# Altium integrated library Connector-SIL-THP.IntLib: 464 symbols (part 1 of 2) (continued)
## HDR1X36MR2.54THP (continued)

## HTSW-104-8-G-S-RA
designator P?
Header SIL Male THP, 2.54mm Pitch Rt Angle; Manufacturer: Samtec; Package: HTSW-104-8-G-S-RA; EDM-PN: *; Text2: *; Text1: *; Value: HTSW-104-8-G-S-RA; Part Number: HTSW-104-8-G-S-RA; SAAB PN: *
footprint HTSW-104-8-G-S-RA
pins: 1, 2, 3, 4

## HTSW-110-42-G-S
designator P?
Header SIL Male THP, 2.54mm Pitch; Manufacturer: Samtec; Package: TSW-110-14-G-S; EDM-PN: *; Text2: *; Text1: *; Value: HTSW-110-42-G-S; Part Number: HTSW-110-42-G-S; SAAB PN: *
footprint TSW-110-14-G-S (SIL Strip 2.54mm)
pins: 1, 2, 3, 4, 5, 6, 7, 8, 9, 10

## HTSW-110-42-G-S-Rev
designator P?
Header SIL Male THP, 2.54mm Pitch - Reverse mount; Manufacturer: Samtec; Package: TSW-110-14-G-S-Rev; EDM-PN: *; Text2: *; Text1: *; Part Number: HTSW-110-42-G-S; Value: HTSW-110-42-G-S-Rev; SAAB PN: *
footprint TSW-110-14-G-S-REV (SIL Strip 2.54mm - Reverse mount)
pins: 1, 2, 3, 4, 5, 6, 7, 8, 9, 10

## HW-04-08-G-S-393-078
designator P?
Header SIL Male THP, 2.54mm Pitch; Manufacturer: Samtec; Package: HW-04-08-G-S-393-078; EDM-PN: *; Text2: *; Text1: *; Value: HW-04-08-G-S-393-078; Part Number: HW-04-08-G-S-393-078; SAAB PN: *
footprint HW-04-08-G-S-393-078
pins: 1, 2, 3, 4

## HW-05-08-G-S-393-078
designator P?
Header SIL Male THP, 2.54mm Pitch; Manufacturer: Samtec; Package: HW-05-08-G-S-393-078; EDM-PN: *; Text2: *; Text1: *; Value: HW-05-08-G-S-393-078; Part Number: HW-05-08-G-S-393-078; SAAB PN: *
footprint HW-05-08-G-S-393-078
pins: 1, 2, 3, 4, 5

## Jumper-2mm-60800213421-No Part
designator P?, comment 60800213421  (mechanical)
Header SIL Male THP, 2.00mm Pitch; Manufacturer: Wurth; Package: NA; EDM-PN: *; Text2: *; Text1: *; Value: 60800213421; SAAB PN: *; Part Number: 60800213421

## KK-LOCK-2-3.96mm
designator P?  value KK-2-3.96  (hidden comment: KK-LOCK-2-3.96mm)
KK SIL Header with Lock; Manufacturer: Molex; Package: M5273-2; EDM-PN: *; Text2: *; Text1: *; Part Number: 09-65-2028; SAAB PN: *
footprint M5273-2 (Header Friction Lock 3.96 7.16x10.2mm)
pins: 1, 2

## KK-LOCK-2-3.96mm-RT
designator P?  value KK-2-3.96-RT  (hidden comment: KK-LOCK-2-3.96mm-RT)
Header Friction Lock Rt Angle; Manufacturer: Molex; Package: M41792-02-RT; EDM-PN: *; Text2: *; Text1: *; Part Number: 26-60-5020; SAAB PN: *
footprint M41792-02-RT (M41792 3.96mm)
pins: 1, 2

## KK-LOCK-3-3.96mm
designator P?  value KK-3-3.96  (hidden comment: KK-LOCK-3-3.96mm)
KK SIL Header with Lock; Manufacturer: Molex; Package: M5273-3; EDM-PN: *; Text2: *; Text1: *; Part Number: 09-65-2038; SAAB PN: *
footprint M5273-3 (Header Friction Lock 3.96 11.12x10.2mm)
pins: 1, 2, 3

## KK-LOCK-3-3.96mm-RT
designator P?  value KK-3-3.96-RT  (hidden comment: KK-LOCK-3-3.96mm-RT)
Header Friction Lock Rt Angle; Manufacturer: Molex; Package: M41792-03-RT; EDM-PN: *; Text2: *; Text1: *; Part Number: 26-60-5030; SAAB PN: *
footprint M41792-03-RT (M41792 3.96mm)
pins: 1, 2, 3

## KK-LOCK-4-3.96mm
designator P?  value KK-4-3.96  (hidden comment: KK-LOCK-4-3.96mm)
KK SIL Header with Lock; Manufacturer: Molex; Package: M5273-4; EDM-PN: *; Text2: *; Text1: *; Part Number: 09-65-2048; SAAB PN: *
footprint M5273-4 (Header Friction Lock 3.96 15.08x10.2mm)
pins: 1, 2, 3, 4

## KK-LOCK-4-3.96mm-RT
designator P?  value KK-4-3.96-RT  (hidden comment: KK-LOCK-4-3.96mm-RT)
Header Friction Lock Rt Angle; Manufacturer: Molex; Package: M41792-04-RT; EDM-PN: *; Text2: *; Text1: *; Part Number: 26-60-5040; SAAB PN: *
footprint M41792-04-RT (M41792 3.96mm)
pins: 1, 2, 3, 4

## KK-LOCK-5-3.96mm
designator P?  value KK-5-3.96  (hidden comment: KK-LOCK-5-3.96mm)
KK SIL Header with Lock; Manufacturer: Molex; Package: M5273-5; EDM-PN: *; Text2: *; Text1: *; Part Number: 09-65-2058; SAAB PN: *
footprint M5273-5 (Header Friction Lock 3.96 19.04x10.2mm)
pins: 1, 2, 3, 4, 5

## KK-LOCK-5-3.96mm-RT
designator P?  value KK-5-3.96-RT  (hidden comment: KK-LOCK-5-3.96mm-RT)
Header Friction Lock Rt Angle; Manufacturer: Molex; Package: M41792-05-RT; EDM-PN: *; Text2: *; Text1: *; Part Number: 26-60-5050; SAAB PN: *
footprint M41792-05-RT (M41792 3.96mm)
pins: 1, 2, 3, 4, 5

## KK-LOCK-6-3.96mm
designator P?  value KK-6-3.96  (hidden comment: KK-LOCK-6-3.96mm)
KK SIL Header with Lock; Manufacturer: Molex; Package: M5273-6; EDM-PN: *; Text2: *; Text1: *; Part Number: 09-65-2068; SAAB PN: *
footprint M5273-6 (Header Friction Lock 3.96 23.00x10.2mm)
pins: 1, 2, 3, 4, 5, 6

## KK-LOCK-7-3.96mm
designator P?  value KK-7-3.96  (hidden comment: KK-LOCK-7-3.96mm)
KK SIL Header with Lock; Manufacturer: Molex; Package: M5273-7; EDM-PN: *; Text2: *; Text1: *; Part Number: 09-65-2078; SAAB PN: *
footprint M5273-7 (Header Friction Lock 3.96 26.96x10.2mm)
pins: 1, 2, 3, 4, 5, 6, 7

## KK-LOCK-8-3.96mm
designator P?  value KK-8-3.96  (hidden comment: KK-LOCK-8-3.96mm)
KK SIL Header with Lock; Manufacturer: Molex; Package: M5273-8; EDM-PN: *; Text2: *; Text1: *; Part Number: 09-65-2088; SAAB PN: *
footprint M5273-8 (Header Friction Lock 3.96 30.92x10.2mm)
pins: 1, 2, 3, 4, 5, 6, 7, 8

## MC34749
designator P?
Header SIL 2.54mm Rt Angle; Manufacturer: Multicomp; Package: MC34749; EDM-PN: *; Text2: *; Text1: *; Part Number: MC34749; Value: MC34749; SAAB PN: *
footprint MC34749 (MC34749 2.54mm)
pins: 1, 2, 3, 4

## PHSS02G10-14-3.0-RH
designator P?
Header SIL Male THP, 2.54mm Pitch; Manufacturer: Mantech; Package: PHSS02G10-14-3.0-RH; EDM-PN: *; Text2: *; Text1: *; Value: PHSS02G10-14-3.0-RH; SAAB PN: *; Part Number: PHSS02G10-14-3.0-RH
footprint PHSS02G10-14-3.0-RH (SIL Strip 2.54mm)
pins: 1, 2

## PHSS03G10-14-3.0-RH
designator P?
Header SIL Male THP, 2.54mm Pitch; Manufacturer: Mantech; Package: PHSS03G10-14-3.0-RH; EDM-PN: *; Text2: *; Text1: *; Value: PHSS03G10-14-3.0-RH; Part Number: PHSS03G10-14-3.0-RH; SAAB PN: *
footprint PHSS03G10-14-3.0-RH (SIL Strip 2.54mm)
pins: 1, 2, 3

## PHSS04G10-14-3.0-RH
designator P?
Header SIL Male THP, 2.54mm Pitch; Manufacturer: Mantech; Package: PHSS04G10-14-3.0-RH; EDM-PN: *; Text2: *; Text1: *; Value: PHSS04G10-14-3.0-RH; Part Number: PHSS04G10-14-3.0-RH; SAAB PN: *
footprint PHSS04G10-14-3.0-RH (SIL Strip 2.54mm)
pins: 1, 2, 3, 4

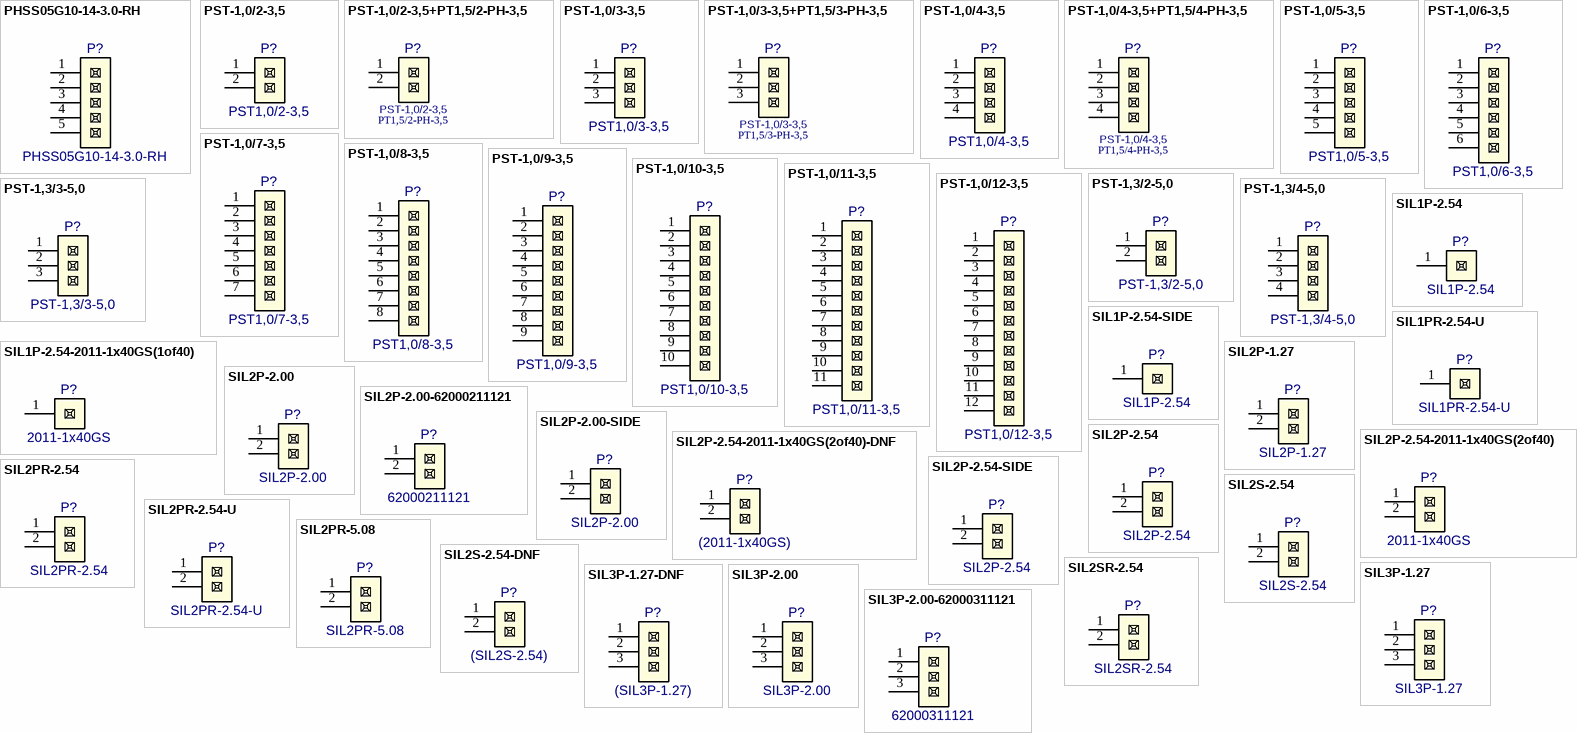
[diagram p5: symbols PHSS05G10-14-3.0-RH to SIL3P-2.00-62000311121]

## PHSS05G10-14-3.0-RH
designator P?
Header SIL Male THP, 2.54mm Pitch; Manufacturer: Mantech; Package: PHSS05G10-14-3.0-RH; EDM-PN: *; Text2: *; Text1: *; Value: PHSS05G10-14-3.0-RH; Part Number: PHSS05G10-14-3.0-RH; SAAB PN: *
footprint PHSS05G10-14-3.0-RH (SIL Strip 2.54mm)
pins: 1, 2, 3, 4, 5

## PST-1,0/2-3,5
designator P?  Part Number: PST1,0/2-3,5  (hidden comment: PST-1,0/2-3,5)
Pin Strip, 3.5mm Pitch; Manufacturer: Phoenix; Value: 19 45 09 6; Package: PST1,0/2-3,5; EDM-PN: *; Text2: *; Text1: *; SAAB PN: *
footprint PST1,0/2-3,5 (Pin Strip, 3.5mm Pitch)
pins: 1, 2

## PST-1,0/2-3,5+PT1,5/2-PH-3,5
designator P?  Text2: PT1,5/2-PH-3,5  Text1: PST-1,0/2-3,5  (hidden comment: PST-1,0/2-3,5+PT1,5/2-PH-3,5)
PIN Strip and Terminal block 3.5mm Pitch; Manufacturer: Phoenix; Package: PST-1,0/2-3,5-PT1,5/2-PH-3,5; EDM-PN: *; Value: PST-1,0/2-3,5+PT1,5/2-PH-3,5; Part Number: PST-1,0/2-3,5+PT1,5/2-PH-3,5; SAAB PN: *
footprint PST1,0/2-3,5-PT1,5/2-PH-3,5 (Pin Strip, 3.5mm Pitch)
pins: 1, 2

## PST-1,0/3-3,5
designator P?  Part Number: PST1,0/3-3,5  (hidden comment: PST-1,0/3-3,5)
Pin Strip, 3.5mm Pitch; Manufacturer: Phoenix; Value: 19 45 10 6; Package: PST1,0/3-3,5; EDM-PN: *; Text2: *; Text1: *; SAAB PN: *
footprint PST1,0/3-3,5 (Pin Strip, 3.5mm Pitch)
pins: 1, 2, 3

## PST-1,0/3-3,5+PT1,5/3-PH-3,5
designator P?  Text2: PT1,5/3-PH-3,5  Text1: PST-1,0/3-3,5  (hidden comment: PST-1,0/3-3,5+PT1,5/3-PH-3,5)
Pin Strip and Terminal block 3.5mm Pitch; Manufacturer: Phoenix; Package: PST-1,0/3-3,5-PT1,5/3-PH-3,5; EDM-PN: *; Value: PST-1,0/3-3,5+PT1,5/3-PH-3,5; Part Number: PST-1,0/3-3,5+PT1,5/3-PH-3,5; SAAB PN: *
footprint PST1,0/3-3,5-PT1,5/3-PH-3,5 (Pin Strip, 3.5mm Pitch)
pins: 1, 2, 3

## PST-1,0/4-3,5
designator P?  Part Number: PST1,0/4-3,5  (hidden comment: PST-1,0/4-3,5)
Pin Strip, 3.5mm Pitch; Manufacturer: Phoenix; Value: 19 45 11 9; Package: PST1,0/4-3,5; EDM-PN: *; Text2: *; Text1: *; SAAB PN: *
footprint PST1,0/4-3,5 (Pin Strip, 3.5mm Pitch)
pins: 1, 2, 3, 4

## PST-1,0/4-3,5+PT1,5/4-PH-3,5
designator P?  Text2: PT1,5/4-PH-3,5  Text1: PST-1,0/4-3,5  (hidden comment: PST-1,0/4-3,5+PT1,5/4-PH-3,5)
Pin Strip and Terminal block 3.5mm Pitch; Manufacturer: Phoenix; Package: PST-1,0/4-3,5-PT1,5/4-PH-3,5; EDM-PN: *; Value: PST-1,0/4-3,5+PT1,5/4-PH-3,5; Part Number: PST-1,0/4-3,5+PT1,5/4-PH-3,5; SAAB PN: *
footprint PST1,0/4-3,5-PT1,5/2-PH-3,5 (Pin Strip, 3.5mm Pitch)
pins: 1, 2, 3, 4

## PST-1,0/5-3,5
designator P?  Part Number: PST1,0/5-3,5  (hidden comment: PST-1,0/5-3,5)
Pin Strip, 3.5mm Pitch; Manufacturer: Phoenix; Value: 19 45 12 2; Package: PST1,0/5-3,5; EDM-PN: *; Text2: *; Text1: *; SAAB PN: *
footprint PST1,0/5-3,5 (Pin Strip, 3.5mm Pitch)
pins: 1, 2, 3, 4, 5

## PST-1,0/6-3,5
designator P?  Part Number: PST1,0/6-3,5  (hidden comment: PST-1,0/6-3,5)
Pin Strip, 3.5mm Pitch; Manufacturer: Phoenix; Value: 19 45 13 5; Package: PST1,0/6-3,5; EDM-PN: *; Text2: *; Text1: *; SAAB PN: *
footprint PST1,0/6-3,5 (Pin Strip, 3.5mm Pitch)
pins: 1, 2, 3, 4, 5, 6

## PST-1,0/7-3,5
designator P?  Part Number: PST1,0/7-3,5  (hidden comment: PST-1,0/7-3,5)
Pin Strip, 3.5mm Pitch; Manufacturer: Phoenix; Value: 19 45 14 8; Package: PST1,0/7-3,5; EDM-PN: *; Text2: *; Text1: *; SAAB PN: *
footprint PST1,0/7-3,5 (Pin Strip, 3.5mm Pitch)
pins: 1, 2, 3, 4, 5, 6, 7

## PST-1,0/8-3,5
designator P?  Part Number: PST1,0/8-3,5  (hidden comment: PST-1,0/8-3,5)
Pin Strip, 3.5mm Pitch; Manufacturer: Phoenix; Value: 19 45 15 1; Package: PST1,0/8-3,5; EDM-PN: *; Text2: *; Text1: *; SAAB PN: *
footprint PST1,0/8-3,5 (Pin Strip, 3.5mm Pitch)
pins: 1, 2, 3, 4, 5, 6, 7, 8

## PST-1,0/9-3,5
designator P?  Part Number: PST1,0/9-3,5  (hidden comment: PST-1,0/9-3,5)
Pin Strip, 3.5mm Pitch; Manufacturer: Phoenix; Value: 19 45 16 4; Package: PST1,0/9-3,5; EDM-PN: *; Text2: *; Text1: *; SAAB PN: *
footprint PST1,0/9-3,5 (Pin Strip, 3.5mm Pitch)
pins: 1, 2, 3, 4, 5, 6, 7, 8, 9

## PST-1,0/10-3,5
designator P?  Part Number: PST1,0/10-3,5  (hidden comment: PST-1,0/10-3,5)
Pin Strip, 3.5mm Pitch; Manufacturer: Phoenix; Value: 19 45 17 7; Package: PST1,0/10-3,5; EDM-PN: *; Text2: *; Text1: *; SAAB PN: *
footprint PST1,0/10-3,5 (Pin Strip, 3.5mm Pitch)
pins: 1, 2, 3, 4, 5, 6, 7, 8, 9, 10

## PST-1,0/11-3,5
designator P?  Part Number: PST1,0/11-3,5  (hidden comment: PST-1,0/11-3,5)
Pin Strip, 3.5mm Pitch; Manufacturer: Phoenix; Value: 19 45 18 0; Package: PST1,0/11-3,5; EDM-PN: *; Text2: *; Text1: *; SAAB PN: *
footprint PST1,0/11-3,5 (Pin Strip, 3.5mm Pitch)
pins: 1, 2, 3, 4, 5, 6, 7, 8, 9, 10, 11

## PST-1,0/12-3,5
designator P?  Part Number: PST1,0/12-3,5  (hidden comment: PST-1,0/12-3,5)
Pin Strip, 3.5mm Pitch; Manufacturer: Phoenix; Value: 19 45 19 3; Package: PST1,0/12-3,5; EDM-PN: *; Text2: *; Text1: *; SAAB PN: *
footprint PST1,0/12-3,5 (Pin Strip, 3.5mm Pitch)
pins: 1, 2, 3, 4, 5, 6, 7, 8, 9, 10, 11, 12

## PST-1,3/2-5,0
designator P?
Pin Strip, 5.0mm Pitch (Plug 1934861); Manufacturer: Phoenix; Package: PST1,3/2-5,0; EDM-PN: *; Text2: *; Text1: *; Value: PST-1,3/2-5,0; SAAB PN: *; Part Number: PST-1,3/2-5,0
footprint PST1,3/2-5,0 (Pin Strip, 5.0mm Pitch)
pins: 1, 2

## PST-1,3/3-5,0
designator P?
Pin Strip, 5.0mm Pitch (Plug 1934874); Manufacturer: Phoenix; Package: PST-1,3/3-5,0; EDM-PN: *; Text2: *; Text1: *; Value: PST-1,3/3-5,0; SAAB PN: *; Part Number: PST-1,3/3-5,0
footprint PST1,3/3-5,0 (Pin Strip, 5.0mm Pitch)
pins: 1, 2, 3

## PST-1,3/4-5,0
designator P?
Pin Strip, 5.0mm Pitch (Plug 1934887); Manufacturer: Phoenix; Package: PST-1,3/4-5,0; EDM-PN: *; Text2: *; Text1: *; Value: PST-1,3/4-5,0; SAAB PN: *; Part Number: PST-1,3/4-5,0
footprint PST1,3/4-5,0 (Pin Strip, 5.0mm Pitch)
pins: 1, 2, 3, 4

## SIL1P-2.54
designator P?
Header SIL Male THP, 2.54mm Pitch; Manufacturer: Various; EDM-PN: CON12; Package: SIL1P-2.54; Text2: *; Text1: *; Value: SIL1P-2.54; SAAB PN: *; Part Number: SIL1P-2.54
footprint SIL1P-2.54 (SIL Strip 2.54mm)
pins: 1

## SIL1P-2.54-2011-1x40GS(1of40)
designator P?, comment value 2011-1x40GS  (hidden comment: 2011-1x40GS(1of40))
Header SIL Male THP, 2.54mm Pitch; Manufacturer: Protronix; EDM-PN: CON12; Package: SIL1P-2.54; Text2: *; Text1: *; SAAB PN: *; Part Number: 2011-1x40GS(1of40)
footprint SIL1P-2.54 (SIL Strip 2.54mm)
pins: 1

## SIL1P-2.54-SIDE
designator P?  Part Number: SIL1P-2.54  (hidden comment: SIL1P-2.54-SIDE)
Header SIL Male THP, 2.54mm Pitch; Manufacturer: Various; EDM-PN: CON12; Package: SIL1P-2.54-SIDE; Text2: *; Text1: *; Value: SIL1P-2.54; SAAB PN: *
footprint SIL1P-2.54-SIDE (SIL Strip 2.54mm)
pins: 1

## SIL1PR-2.54-U
designator P?
Header SIL Male 2.54mm Rt Angle Type-U; Manufacturer: Various; Package: SIL1PR-2.54-U; EDM-PN: *; Text2: *; Text1: *; Part Number: SIL1PR-2.54-U; SAAB PN: *; Value: SIL1PR-2.54-U
footprint SIL1PR-2.54-U (SIL Male Rt Angle THP Header, 2.54mm Pitch Type-U)
pins: 1

## SIL2P-1.27
designator P?
Header SIL Male THP, 1.27mm Pitch; Manufacturer: Various; EDM-PN: CON459 (2 of 20); Package: SIL2P-1.27; Text2: *; Text1: *; Value: SIL2P-1.27; SAAB PN: *; Part Number: SIL2P-1.27
footprint SIL2P-1.27
pins: 1, 2

## SIL2P-2.00
designator P?
Header SIL Male THP, 2.00mm Pitch; Manufacturer: Various; Package: SIL2P-2.00; EDM-PN: *; Text2: *; Text1: *; Value: SIL2P-2.00; SAAB PN: *; Part Number: SIL2P-2.00
footprint SIL2P-2.00 (SIL2P 4.0x2.0mm)
pins: 1, 2

## SIL2P-2.00-62000211121
designator P?, comment 62000211121
Header SIL Male THP, 2.00mm Pitch; Manufacturer: Wurth; Package: 62000211121; EDM-PN: *; Text2: *; Text1: *; Value: 62000211121; SAAB PN: *; Part Number: 62000211121
footprint 62000211121
pins: 1, 2

## SIL2P-2.00-SIDE
designator P?  Part Number: SIL2P-2.00  (hidden comment: SIL2P-2.00-SIDE)
Header SIL Male THP, 2.00mm Pitch; Manufacturer: Various; Package: SIL2P-2.00-SIDE; EDM-PN: *; Text2: *; Text1: *; Value: SIL2P-2.00; SAAB PN: *
footprint SIL2P-2.00-SIDE (SIL2P 4.0x2.0mm)
pins: 1, 2

## SIL2P-2.54
designator P?
Header SIL Male THP, 2.54mm Pitch; Manufacturer: Various; EDM-PN: CON12; Package: SIL2P-2.54; Text2: *; Text1: *; Value: SIL2P-2.54; SAAB PN: *; Part Number: SIL2P-2.54
footprint SIL2P-2.54 (SIL Strip 2.54mm)
pins: 1, 2

## SIL2P-2.54-2011-1x40GS(2of40)
designator P?, comment value 2011-1x40GS  (hidden comment: 2011-1x40GS(2of40))
Header SIL Male THP, 2.54mm Pitch; Manufacturer: Protronix; EDM-PN: CON12; Package: SIL2P-2.54; Text2: *; Text1: *; SAAB PN: *; Part Number: 2011-1x40GS(2of40)
footprint SIL2P-2.54 (SIL Strip 2.54mm)
pins: 1, 2

## SIL2P-2.54-2011-1x40GS(2of40)-DNF
designator P?, comment value (2011-1x40GS)  (hidden comment: 2011-1x40GS(2of40))
Header SIL Male THP, 2.54mm Pitch - Do not Fit; Manufacturer: Protronix; Part Number: DNF - 2011-1x40GS(2of40); EDM-PN: CON12; Package: SIL2P-2.54; Text2: *; Text1: *; SAAB PN: *
footprint SIL2P-2.54 (SIL Strip 2.54mm)
pins: 1, 2

## SIL2P-2.54-SIDE
designator P?  Part Number: SIL2P-2.54  (hidden comment: SIL2P-2.54-SIDE)
Header SIL Male THP, 2.54mm Pitch; Manufacturer: Various; EDM-PN: CON12; Package: SIL2P-2.54-SIDE; Text2: *; Text1: *; Value: SIL2P-2.54; SAAB PN: *
footprint SIL2P-2.54-EDGE (SIL Strip 2.54mm)
pins: 1, 2

## SIL2PR-2.54
designator P?
Header SIL 2.54mm Rt Angle; Manufacturer: Various; Package: SIL2PR-2.54; EDM-PN: *; Text2: *; Text1: *; Part Number: SIL2PR-2.54; SAAB PN: *; Value: SIL2PR-2.54
footprint SIL2PR-2.54 (SIL Male Rt Angle THP Header, 2.54mm Pitch)
pins: 1, 2

## SIL2PR-2.54-U
designator P?
Header SIL Male 2.54mm Rt Angle Type-U; Manufacturer: Various; Package: SIL2PR-2.54-U; EDM-PN: *; Text2: *; Text1: *; Part Number: SIL2PR-2.54-U; SAAB PN: *; Value: SIL2PR-2.54-U
footprint SIL2PR-2.54-U (SIL Male Rt Angle THP Header, 2.54mm Pitch Type-U)
pins: 1, 2

## SIL2PR-5.08
designator P?
Header SIL Male THP, 5.08mm Pitch Rt Angle; Manufacturer: Various; Package: SIL2PR-5.08; EDM-PN: *; Text2: *; Text1: *; Value: SIL2PR-5.08; SAAB PN: *; Part Number: SIL2PR-5.08
footprint SIL2PR-5.08
pins: 1, 2

## SIL2S-2.54
designator P?
Header SIL Female THP, 2.54mm Pitch; Manufacturer: Various; Package: SIL2S-2.54; EDM-PN: *; Text2: *; Text1: *; Value: SIL2S-2.54; SAAB PN: *; Part Number: SIL2S-2.54
footprint SIL2S-2.54 (SIL Female 2.54mm)
pins: 1, 2

## SIL2S-2.54-DNF
designator P?, comment value (SIL2S-2.54)  (hidden comment: SIL2S-2.54)
Header SIL Female THP, 2.54mm Pitch - Do not Fit; Manufacturer: Various; Part Number: DNF - SIL2S-2.54; Package: SIL2S-2.54; EDM-PN: *; Text2: *; Text1: *; SAAB PN: *
footprint SIL2S-2.54 (SIL Female 2.54mm)
pins: 1, 2

## SIL2SR-2.54
designator P?
Header SIL Female THP, 2.54mm Pitch Rt Angle; Manufacturer: Various; Package: SIL2SR-2.54; EDM-PN: *; Text2: *; Text1: *; Value: SIL2SR-2.54; SAAB PN: *; Part Number: SIL2SR-2.54
footprint SIL2SR-2.54 (SIL Strip Female 7.63x8.08mm 2.54mm)
pins: 1, 2

## SIL3P-1.27
designator P?
Header SIL Male THP, 1.27mm Pitch; Manufacturer: Various; EDM-PN: CON459 (3 of 20); Package: SIL3P-1.27; Text2: *; Text1: *; Value: SIL3P-1.27; SAAB PN: *; Part Number: SIL3P-1.27
footprint SIL3P-1.27
pins: 1, 2, 3

## SIL3P-1.27-DNF
designator P?  value (SIL3P-1.27)  (hidden comment: SIL3P-1.27-DNF)
Header SIL Male THP, 1.27mm Pitch - Do not Fit; Manufacturer: Various; Part Number: DNF - SIL3P-1.27; EDM-PN: CON459 (3 of 20); Package: SIL3P-1.27; Text2: *; Text1: *; SAAB PN: *
footprint SIL3P-1.27
pins: 1, 2, 3

## SIL3P-2.00
designator P?
Header SIL Male THP, 2.00mm Pitch; Manufacturer: Various; Package: SIL3P-2.00; EDM-PN: *; Text2: *; Text1: *; Value: SIL3P-2.00; SAAB PN: *; Part Number: SIL3P-2.00
footprint SIL3P-2.00 (SIL3P 6.0x2.0mm)
pins: 1, 2, 3

## SIL3P-2.00-62000311121
designator P?, comment 62000311121
Header SIL Male THP, 2.00mm Pitch; Manufacturer: Wurth; Package: SIL3P-2.00; EDM-PN: *; Text2: *; Text1: *; Value: 62000311121; SAAB PN: *; Part Number: 62000311121
footprint 62000311121 (SIL3P 6.0x2.0mm)
pins: 1, 2, 3

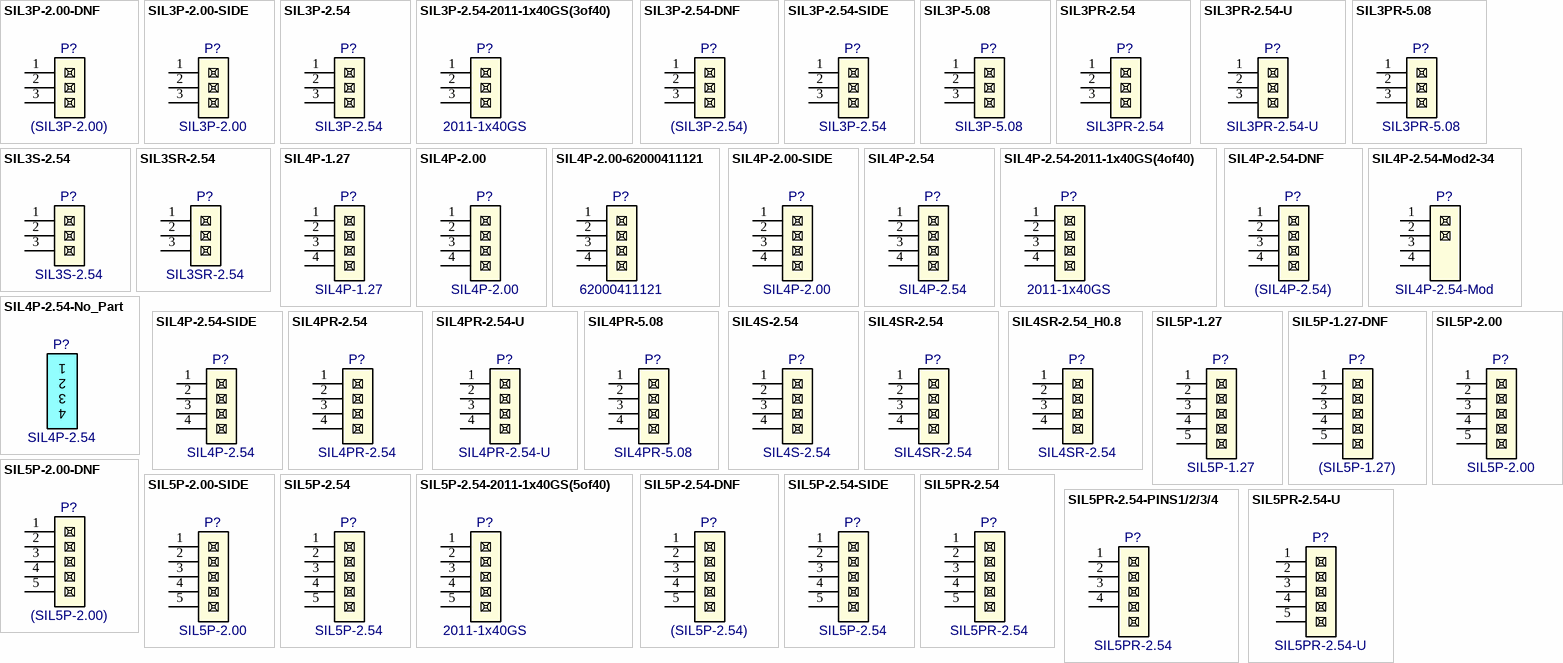
[diagram p6: symbols SIL3P-2.00-DNF to SIL5PR-2.54-U]

## SIL3P-2.00-DNF
designator P?  value (SIL3P-2.00)  (hidden comment: SIL3P-2.00-DNF)
Header SIL Male THP, 2.00mm Pitch - Do not Fit; Manufacturer: Various; Part Number: DNF - SIL3P-2.00; Package: SIL3P-2.00; EDM-PN: *; Text2: *; Text1: *; SAAB PN: *
footprint SIL3P-2.00 (SIL3P 6.0x2.0mm)
pins: 1, 2, 3

## SIL3P-2.00-SIDE
designator P?  Part Number: SIL3P-2.00  (hidden comment: SIL3P-2.00-SIDE)
Header SIL Male THP, 2.00mm Pitch; Manufacturer: Various; Package: SIL3P-2.00-SIDE; EDM-PN: *; Text2: *; Text1: *; Value: SIL3P-2.00; SAAB PN: *
footprint SIL3P-2.00-SIDE (SIL3P 6.0x2.0mm)
pins: 1, 2, 3

## SIL3P-2.54
designator P?
Header SIL Male THP, 2.54mm Pitch; Manufacturer: Various; EDM-PN: CON12; Package: SIL3P-2.54; Text2: *; Text1: *; Value: SIL3P-2.54; SAAB PN: *; Part Number: SIL3P-2.54
footprint SIL3P-2.54 (SIL Strip 2.54mm)
pins: 1, 2, 3

## SIL3P-2.54-2011-1x40GS(3of40)
designator P?, comment value 2011-1x40GS  (hidden comment: 2011-1x40GS(3of40))
Header SIL Male THP, 2.54mm Pitch; Manufacturer: Protronix; EDM-PN: CON12; Package: SIL3P-2.54; Text2: *; Text1: *; SAAB PN: *; Part Number: 2011-1x40GS(3of40)
footprint SIL3P-2.54 (SIL Strip 2.54mm)
pins: 1, 2, 3

## SIL3P-2.54-DNF
designator P?  value (SIL3P-2.54)  (hidden comment: SIL3P-2.54-DNF)
Header SIL Male THP, 2.54mm Pitch - Do not Fit; Manufacturer: Various; Part Number: DNF - SIL3P-2.54; EDM-PN: DNF; Package: SIL3P-2.54; Text2: *; Text1: *; SAAB PN: *
footprint SIL3P-2.54 (SIL Strip 2.54mm)
pins: 1, 2, 3

## SIL3P-2.54-SIDE
designator P?  Part Number: SIL3P-2.54  (hidden comment: SIL3P-2.54-SIDE)
Header SIL Male THP, 2.54mm Pitch; Manufacturer: Various; EDM-PN: CON12; Package: SIL3P-2.54-SIDE; Text2: *; Text1: *; Value: SIL3P-2.54; SAAB PN: *
footprint SIL3P-2.54-EDGE (SIL Strip 2.54mm)
pins: 1, 2, 3

## SIL3P-5.08
designator P?
Header SIL Male THP, 5.08mm Pitch; Manufacturer: Various; Package: SIL3P-5.08; EDM-PN: *; Text2: *; Text1: *; Value: SIL3P-5.08; Part Number: SIL3P-5.08; SAAB PN: *
footprint SIL3P-5.08
pins: 1, 2, 3

## SIL3PR-2.54
designator P?
Header SIL Male 2.54mm Rt Angle; Manufacturer: Various; Package: SIL3PR-2.54; EDM-PN: *; Text2: *; Text1: *; Part Number: SIL3PR-2.54; SAAB PN: *; Value: SIL3PR-2.54
footprint SIL3PR-2.54 (SIL Male Rt Angle THP Header, 2.54mm Pitch)
pins: 1, 2, 3

## SIL3PR-2.54-U
designator P?
Header SIL Male 2.54mm Rt Angle Type-U; Manufacturer: Various; Package: SIL3PR-2.54-U; EDM-PN: *; Text2: *; Text1: *; Part Number: SIL3PR-2.54-U; SAAB PN: *; Value: SIL3PR-2.54-U
footprint SIL3PR-2.54-U (SIL Male Rt Angle THP Header, 2.54mm Pitch Type-U)
pins: 1, 2, 3

## SIL3PR-5.08
designator P?
Header SIL Male THP, 5.08mm Pitch Rt Angle; Manufacturer: Various; Package: SIL3PR-5.08; EDM-PN: *; Text2: *; Text1: *; Value: SIL3PR-5.08; Part Number: SIL3PR-5.08; SAAB PN: *
footprint SIL3PR-5.08
pins: 1, 2, 3

## SIL3S-2.54
designator P?
Header SIL Female THP, 2.54mm Pitch; Manufacturer: Various; EDM-PN: CON425; Package: SIL3S-2.54; Text2: *; Text1: *; Value: SIL3S-2.54; SAAB PN: *; Part Number: SIL3S-2.54
footprint SIL3S-2.54 (SIL Female 2.54mm)
pins: 1, 2, 3